# Altium footprint library TH Connectors.PcbLib: 140 footprints (part 7 of 9)
Each footprint in its own frame and in the unit in brackets; x right, y up, seen from the top. Pads: shape width x height; smd on the part's side, far side on the other; paste and mask are expansions set on the pad; w line width, h text height; cw(c..) or ccw(c..) is an arc to the next point about the centre after c.
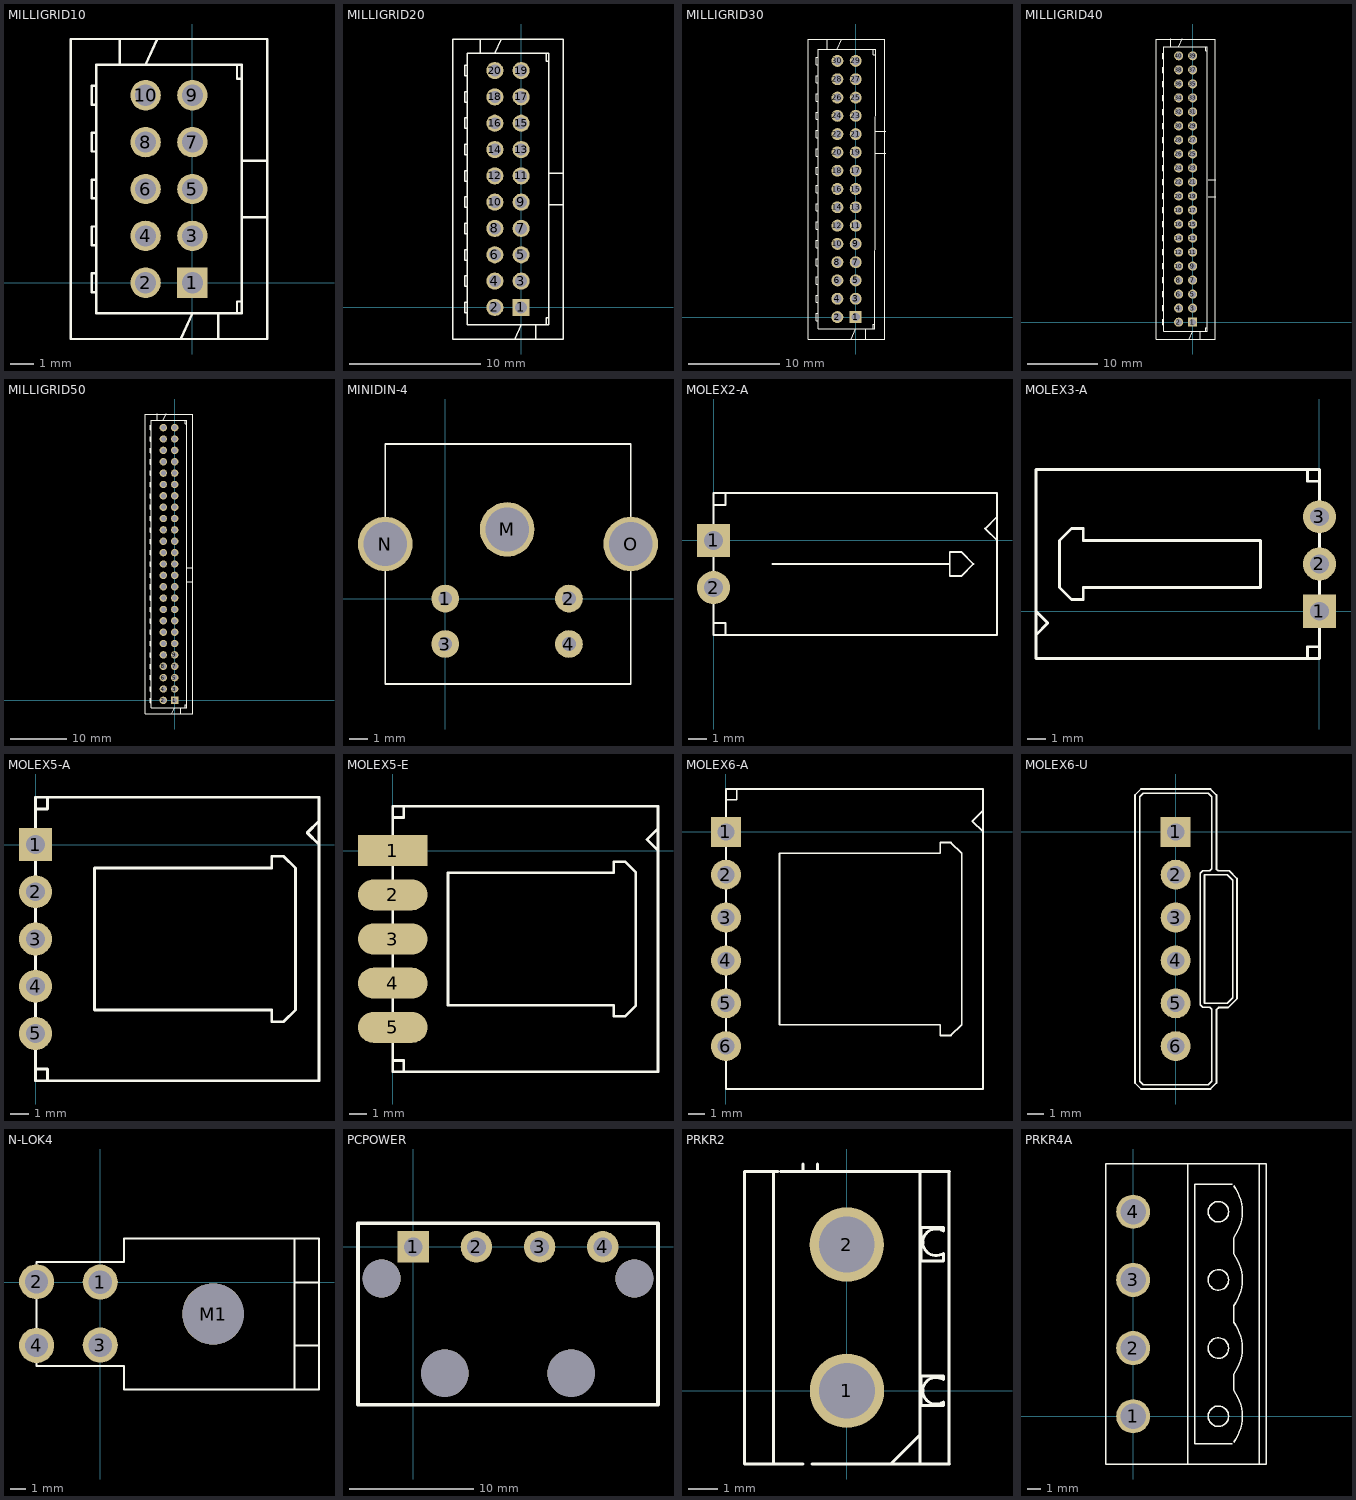
[diagram p6: the footprints below, top view; thin cyan lines are the x and y axes]

## MILLIGRID10 [mm]
pads (10):
  rect 1.3x1.3 hole 0.9: 1(0,0)
  round 1.3 hole 0.9: 2(-2,0) 3(0,2) 4(-2,2) 5(0,4) 6(-2,4) 7(0,6) 8(-2,6) 9(0,8) 10(-2,8)
Top Overlay:
  lines w0.102: -4.1,-0.4 -4.3,-0.4 -4.3,0.2 -4.3,0.4 -4.1,0.4 ; -4.1,1.6 -4.3,1.6 -4.3,2.2 -4.3,2.4 -4.1,2.4 ; -4.1,3.6 -4.3,3.6 -4.3,4.2 -4.3,4.4 -4.1,4.4 ; -4.1,5.6 -4.3,5.6 -4.3,6.2 -4.3,6.4 -4.1,6.4 ; -4.1,7.6 -4.3,7.6 -4.3,8.2 -4.3,8.4 -4.1,8.4 ; -3.1,9.3 -3.1,10.4 ; -2,9.3 -1.5,10.4 ; -0.5,-2.4 0,-1.3 ; 1.1,-2.4 1.1,-1.3 ; 1.9,-1.3 1.9,-0.8 2.1,-0.8 ; 1.9,9.3 1.9,8.7 2.1,8.7 ; 2.1,2.8 3.2,2.8 ; 2.1,5.2 3.2,5.2 ; -5.2,-2.4 -5.2,0 -5.2,10.4 -1,10.4 3.2,10.4 3.2,-2.4 -1,-2.4 -5.2,-2.4 ; -4.3,10.4 -4.1,10.4 -4.3,10.4 ; -4.1,-1.3 -4.1,0 -4.1,9.3 -2.8,9.3 -1,9.3 0.8,9.3 2.1,9.3 2.1,0 2.1,-1.3 0.8,-1.3 -1,-1.3 -2.8,-1.3 -4.1,-1.3

## MILLIGRID20 [mm]
pads (20):
  rect 1.3x1.3 hole 0.9: 1(0,0)
  round 1.3 hole 0.9: 2(-2,0) 3(0,2) 4(-2,2) 5(0,4) 6(-2,4) 7(0,6) 8(-2,6) 9(0,8) 10(-2,8) 11(0,10) 12(-2,10) 13(0,12) 14(-2,12) 15(0,14) 16(-2,14) 17(0,16) 18(-2,16) 19(0,18) 20(-2,18)
Top Overlay:
  lines w0.102: -4.3,20.4 -4.1,20.4 ; -4.1,-0.4 -4.3,-0.4 -4.3,0.2 -4.3,0.4 -4.1,0.4 ; -4.1,1.6 -4.3,1.6 -4.3,2.2 -4.3,2.4 -4.1,2.4 ; -4.1,3.6 -4.3,3.6 -4.3,4.2 -4.3,4.4 -4.1,4.4 ; -4.1,5.6 -4.3,5.6 -4.3,6.2 -4.3,6.4 -4.1,6.4 ; -4.1,7.6 -4.3,7.6 -4.3,8.2 -4.3,8.4 -4.1,8.4 ; -4.1,9.6 -4.3,9.6 -4.3,10.2 -4.3,10.4 -4.1,10.4 ; -4.1,11.6 -4.3,11.6 -4.3,12.2 -4.3,12.4 -4.1,12.4 ; -4.1,13.6 -4.3,13.6 -4.3,14.2 -4.3,14.4 -4.1,14.4 ; -4.1,15.6 -4.3,15.6 -4.3,16.2 -4.3,16.4 -4.1,16.4 ; -4.1,17.6 -4.3,17.6 -4.3,18.2 ; -3.1,19.3 -3.1,20.4 ; -2,19.3 -1.5,20.4 ; -0.5,-2.4 0,-1.3 ; 1.1,-2.4 1.1,-1.3 ; 1.9,-1.3 1.9,-0.8 2.1,-0.8 ; 1.9,19.3 1.9,18.7 2.1,18.7 ; 2.1,7.8 3.2,7.8 ; 2.1,10.2 3.2,10.2 ; -4.3,18.2 -4.3,18.4 ; -4.3,18.2 -4.3,18.4 ; -4.3,18.4 -4.1,18.4 -4.3,18.4 ; -5.2,-2.4 -1,-2.4 3.2,-2.4 3.2,20.4 -1,20.4 -5.2,20.4 -5.2,0 -5.2,-2.4 ; -4.1,-1.3 -2.8,-1.3 -1,-1.3 0.8,-1.3 2.1,-1.3 2.1,0 2.1,19.3 0.8,19.3 -1,19.3 -2.8,19.3 -4.1,19.3 -4.1,0 -4.1,-1.3

## MILLIGRID30 [mm]
pads (30):
  rect 1.3x1.3 hole 0.9: 1(0,0)
  round 1.3 hole 0.9: 2(-2,0) 3(0,2) 4(-2,2) 5(0,4) 6(-2,4) 7(0,6) 8(-2,6) 9(0,8) 10(-2,8) 11(0,10) 12(-2,10) 13(0,12) 14(-2,12) 15(0,14) 16(-2,14) 17(0,16) 18(-2,16) 19(0,18) 20(-2,18) 21(0,20) 22(-2,20) 23(0,22) 24(-2,22) 25(0,24) 26(-2,24) 27(0,26) 28(-2,26) 29(0,28) 30(-2,28)
Top Overlay:
  lines w0.102: -4.3,30.4 -4.1,30.4 ; -4.1,-0.4 -4.3,-0.4 -4.3,0.2 -4.3,0.4 -4.1,0.4 ; -4.1,1.6 -4.3,1.6 -4.3,2.2 -4.3,2.4 -4.1,2.4 ; -4.1,3.6 -4.3,3.6 -4.3,4.2 -4.3,4.4 -4.1,4.4 ; -4.1,5.6 -4.3,5.6 -4.3,6.2 -4.3,6.4 -4.1,6.4 ; -4.1,7.6 -4.3,7.6 -4.3,8.2 -4.3,8.4 -4.1,8.4 ; -4.1,9.6 -4.3,9.6 -4.3,10.2 -4.3,10.4 -4.1,10.4 ; -4.1,11.6 -4.3,11.6 -4.3,12.2 -4.3,12.4 -4.1,12.4 ; -4.1,13.6 -4.3,13.6 -4.3,14.2 -4.3,14.4 -4.1,14.4 ; -4.1,15.6 -4.3,15.6 -4.3,16.2 -4.3,16.4 -4.1,16.4 ; -4.1,17.6 -4.3,17.6 -4.3,18.2 -4.3,18.4 -4.1,18.4 ; -4.1,19.6 -4.3,19.6 -4.3,20.2 -4.3,20.4 -4.1,20.4 ; -4.1,21.6 -4.3,21.6 -4.3,22.2 -4.3,22.4 -4.1,22.4 ; -4.1,23.6 -4.3,23.6 -4.3,24.2 -4.3,24.4 -4.1,24.4 ; -4.1,25.6 -4.3,25.6 -4.3,26.2 -4.3,26.4 -4.1,26.4 ; -4.1,27.6 -4.3,27.6 -4.3,28.2 -4.3,28.4 -4.1,28.4 ; -3.1,29.3 -3.1,30.4 ; -2,29.3 -1.5,30.4 ; -0.5,-2.4 0,-1.3 ; 1.1,-2.4 1.1,-1.3 ; 1.9,-1.3 1.9,-0.8 2.1,-0.8 ; 1.9,29.3 1.9,28.7 2.1,28.7 ; 2.1,29.3 0.8,29.3 -1,29.3 -2.8,29.3 -4.1,29.3 -4.1,0 -4.1,-1.3 -2.8,-1.3 -1,-1.3 0.8,-1.3 2.1,-1.3 2.1,0 2.2,29.3 ; 2.2,17.9 3.3,17.9 ; 2.2,20.3 3.3,20.3 ; -5.2,-2.4 -5.2,0 -5.2,30.4 -1,30.4 3.2,30.4 3.2,-2.4 -1,-2.4 -5.2,-2.4

## MILLIGRID40 [mm]
pads (40):
  rect 1.3x1.3 hole 0.9: 1(0,0)
  round 1.3 hole 0.9: 2(-2,0) 3(0,2) 4(-2,2) 5(0,4) 6(-2,4) 7(0,6) 8(-2,6) 9(0,8) 10(-2,8) 11(0,10) 12(-2,10) 13(0,12) 14(-2,12) 15(0,14) 16(-2,14) 17(0,16) 18(-2,16) 19(0,18) 20(-2,18) 21(0,20) 22(-2,20) 23(0,22) 24(-2,22) 25(0,24) 26(-2,24) 27(0,26) 28(-2,26) 29(0,28) 30(-2,28) 31(0,30) 32(-2,30) 33(0,32) 34(-2,32) 35(0,34) 36(-2,34) 37(0,36) 38(-2,36) 39(0,38) 40(-2,38)
Top Overlay:
  lines w0.102: -4.1,-0.4 -4.3,-0.4 -4.3,0.2 -4.3,0.4 -4.1,0.4 ; -4.1,1.6 -4.3,1.6 -4.3,2.2 -4.3,2.4 -4.1,2.4 ; -4.1,3.6 -4.3,3.6 -4.3,4.2 -4.3,4.4 -4.1,4.4 ; -4.1,5.6 -4.3,5.6 -4.3,6.2 -4.3,6.4 -4.1,6.4 ; -4.1,7.6 -4.3,7.6 -4.3,8.2 -4.3,8.4 -4.1,8.4 ; -4.1,9.6 -4.3,9.6 -4.3,10.2 -4.3,10.4 -4.1,10.4 ; -4.1,11.6 -4.3,11.6 -4.3,12.2 -4.3,12.4 -4.1,12.4 ; -4.1,13.6 -4.3,13.6 -4.3,14.2 -4.3,14.4 -4.1,14.4 ; -4.1,15.6 -4.3,15.6 -4.3,16.2 -4.3,16.4 -4.1,16.4 ; -4.1,17.6 -4.3,17.6 -4.3,18.2 -4.3,18.4 -4.1,18.4 ; -4.1,19.6 -4.3,19.6 -4.3,20.2 -4.3,20.4 -4.1,20.4 ; -4.1,21.6 -4.3,21.6 -4.3,22.2 -4.3,22.4 -4.1,22.4 ; -4.1,23.6 -4.3,23.6 -4.3,24.2 -4.3,24.4 -4.1,24.4 ; -4.1,25.6 -4.3,25.6 -4.3,26.2 -4.3,26.4 -4.1,26.4 ; -4.1,27.6 -4.3,27.6 -4.3,28.2 -4.3,28.4 -4.1,28.4 ; -4.1,29.6 -4.3,29.6 -4.3,30.2 -4.3,30.4 -4.1,30.4 ; -4.1,31.6 -4.3,31.6 -4.3,32.2 -4.3,32.4 -4.1,32.4 ; -4.1,33.6 -4.3,33.6 -4.3,34.2 -4.3,34.4 -4.1,34.4 ; -4.1,35.6 -4.3,35.6 -4.3,36.2 -4.3,36.4 -4.1,36.4 ; -4.1,37.6 -4.3,37.6 -4.3,38.2 -4.3,38.4 -4.1,38.4 ; -3.1,39.3 -3.1,40.4 ; -2,39.3 -1.5,40.4 ; -0.5,-2.4 0,-1.3 ; 1.1,-2.4 1.1,-1.3 ; 1.9,-1.3 1.9,-0.8 2.1,-0.8 ; 1.9,39.3 1.9,38.7 2.1,38.7 ; 2.2,17.9 3.3,17.9 ; 2.2,20.3 3.3,20.3 ; -5.2,-2.4 -1,-2.4 3.2,-2.4 3.2,40.4 -1,40.4 -5.2,40.4 -5.2,0 -5.2,-2.4 ; -4.1,-1.3 -2.8,-1.3 -1,-1.3 0.8,-1.3 2.1,-1.3 2.1,0 2.1,39.3 0.8,39.3 -1,39.3 -2.8,39.3 -4.1,39.3 -4.1,0 -4.1,-1.3

## MILLIGRID50 [mm]
pads (50):
  rect 1.3x1.3 hole 0.9: 1(0,0)
  round 1.3 hole 0.9: 2(-2,0) 3(0,2) 4(-2,2) 5(0,4) 6(-2,4) 7(0,6) 8(-2,6) 9(0,8) 10(-2,8) 11(0,10) 12(-2,10) 13(0,12) 14(-2,12) 15(0,14) 16(-2,14) 17(0,16) 18(-2,16) 19(0,18) 20(-2,18) 21(0,20) 22(-2,20) 23(0,22) 24(-2,22) 25(0,24) 26(-2,24) 27(0,26) 28(-2,26) 29(0,28) 30(-2,28) 31(0,30) 32(-2,30) 33(0,32) 34(-2,32) 35(0,34) 36(-2,34) 37(0,36) 38(-2,36) 39(0,38) 40(-2,38) 41(0,40) 42(-2,40) 43(0,42) 44(-2,42) 45(0,44) 46(-2,44) 47(0,46) 48(-2,46) 49(0,48) 50(-2,48)
Top Overlay:
  lines w0.102: -4.1,-0.4 -4.3,-0.4 -4.3,0.2 -4.3,0.4 -4.1,0.4 ; -4.1,1.6 -4.3,1.6 -4.3,2.2 -4.3,2.4 -4.1,2.4 ; -4.1,3.6 -4.3,3.6 -4.3,4.2 -4.3,4.4 -4.1,4.4 ; -4.1,5.6 -4.3,5.6 -4.3,6.2 -4.3,6.4 -4.1,6.4 ; -4.1,7.6 -4.3,7.6 -4.3,8.2 -4.3,8.4 -4.1,8.4 ; -4.1,9.6 -4.3,9.6 -4.3,10.2 -4.3,10.4 -4.1,10.4 ; -4.1,11.6 -4.3,11.6 -4.3,12.2 -4.3,12.4 -4.1,12.4 ; -4.1,13.6 -4.3,13.6 -4.3,14.2 -4.3,14.4 -4.1,14.4 ; -4.1,15.6 -4.3,15.6 -4.3,16.2 -4.3,16.4 -4.1,16.4 ; -4.1,17.6 -4.3,17.6 -4.3,18.2 -4.3,18.4 -4.1,18.4 ; -4.1,19.6 -4.3,19.6 -4.3,20.2 -4.3,20.4 -4.1,20.4 ; -4.1,21.6 -4.3,21.6 -4.3,22.2 -4.3,22.4 -4.1,22.4 ; -4.1,23.6 -4.3,23.6 -4.3,24.2 -4.3,24.4 -4.1,24.4 ; -4.1,25.6 -4.3,25.6 -4.3,26.2 -4.3,26.4 -4.1,26.4 ; -4.1,27.6 -4.3,27.6 -4.3,28.2 -4.3,28.4 -4.1,28.4 ; -4.1,29.6 -4.3,29.6 -4.3,30.2 -4.3,30.4 -4.1,30.4 ; -4.1,31.6 -4.3,31.6 -4.3,32.2 -4.3,32.4 -4.1,32.4 ; -4.1,33.6 -4.3,33.6 -4.3,34.2 -4.3,34.4 -4.1,34.4 ; -4.1,35.6 -4.3,35.6 -4.3,36.2 -4.3,36.4 -4.1,36.4 ; -4.1,37.6 -4.3,37.6 -4.3,38.2 -4.3,38.4 -4.1,38.4 ; -4.1,39.6 -4.3,39.6 -4.3,40.2 -4.3,40.4 -4.1,40.4 ; -4.1,41.6 -4.3,41.6 -4.3,42.2 -4.3,42.4 -4.1,42.4 ; -4.1,43.6 -4.3,43.6 -4.3,44.2 -4.3,44.4 -4.1,44.4 ; -4.1,45.6 -4.3,45.6 -4.3,46.2 -4.3,46.4 -4.1,46.4 ; -4.1,47.6 -4.3,47.6 -4.3,48.2 -4.3,48.4 -4.1,48.4 ; -3.1,49.3 -3.1,50.4 ; -2,49.3 -1.5,50.4 ; -0.5,-2.4 0,-1.3 ; 1.1,-2.4 1.1,-1.3 ; 1.9,-1.3 1.9,-0.8 2.1,-0.8 ; 1.9,49.3 1.9,48.7 2.1,48.7 ; 2.1,20.9 3.2,20.9 ; 2.1,23.3 3.2,23.3 ; -5.2,-2.4 -5.2,0 -5.2,48 -5.2,50.4 -1,50.4 3.2,50.4 3.2,48 3.2,-2.4 -1,-2.4 -5.2,-2.4 ; -4.1,-1.3 -4.1,0 -4.1,48 -4.1,49.3 -2.8,49.3 -1,49.3 0.8,49.3 2.1,49.3 2.1,0 2.1,-1.3 0.8,-1.3 -1,-1.3 -2.8,-1.3 -4.1,-1.3

## MINIDIN-4 [mm]
pads (7):
  round 1.524 hole 0.762: 1(0,0) 2(6.8,0) 3(0,-2.5) 4(6.8,-2.5)
  round 3 hole 2.4: M(3.4,3.8) N(-3.3,3) O(10.2,3)
Top Overlay:
  lines w0.102: -3.3,-4.7 10.2,-4.7 10.2,8.5 -3.3,8.5 -3.3,-4.7

## MOLEX2-A [mil]
pads (2):
  rect 70x70 hole 40: 1(0,0)
  round 70 hole 40: 2(0,-100)
Top Overlay:
  lines w4: 0,-175 25,-175 25,-200 ; 0,75 25,75 25,100 ; 600,-200 150,-200 0,-200 0,100 150,100 300,100 450,100 600,100 600,-199 ; 600,0 575,25 600,50 ; 500,-50 125,-50 500,-50 ; 500,-50 500,-75 525,-75 550,-50 525,-25 500,-25 500,-50

## MOLEX3-A [mil]
pads (3):
  rect 70x70 hole 40: 1(0,0)
  round 70 hole 40: 2(0,100) 3(0,200)
Top Overlay:
  lines w6: -600,-50 -575,-25 -600,0 ; -25,-100 -25,-75 0,-75 ; -25,300 -25,275 0,275 ; -550,50 -525,25 -500,25 -500,50 -125,50 ; -550,50 -550,150 ; -550,50 -550,150 ; -550,150 -525,175 -500,175 -500,150 -125,150 ; -125,50 -125,150 ; -125,50 -125,150 ; -600,-100 -450,-100 -300,-100 -150,-100 0,-100 0,300 -150,300 -600,300 -600,-100

## MOLEX5-A [mil]
pads (5):
  rect 70x70 hole 40: 1(0,0)
  round 70 hole 40: 2(0,-100) 3(0,-200) 4(0,-300) 5(0,-400)
Top Overlay:
  lines w6: 0,-475 25,-475 25,-500 ; 0,75 25,75 25,100 ; 600,0 575,25 600,50 ; 125,-350 125,-50 ; 125,-350 500,-350 500,-375 525,-375 550,-350 ; 125,-350 125,-50 ; 125,-50 500,-50 500,-25 525,-25 550,-50 ; 550,-350 550,-50 ; 550,-350 550,-50 ; 0,-500 0,100 150,100 300,100 450,100 600,100 600,-500 150,-500 0,-500

## MOLEX5-E [mil]
pads (5):
  rect 157.48x70 smd: 1(0,0)
  oval 157.48x70 smd: 2(0,-100) 3(0,-200) 4(0,-300) 5(0,-400)
Top Overlay:
  lines w6: 0,-475 25,-475 25,-500 ; 0,75 25,75 25,100 ; 600,0 575,25 600,50 ; 125,-350 125,-50 ; 125,-350 500,-350 500,-375 525,-375 550,-350 ; 125,-350 125,-50 ; 125,-50 500,-50 500,-25 525,-25 550,-50 ; 550,-350 550,-50 ; 550,-350 550,-50 ; 0,-500 150,-500 600,-500 600,100 450,100 300,100 150,100 0,100 0,-500

## MOLEX6-A [mil]
pads (6):
  rect 70x70 hole 40: 1(0,0)
  round 70 hole 40: 2(0,-100) 3(0,-200) 4(0,-300) 5(0,-400) 6(0,-500)
Top Overlay:
  lines w4: 0,-500 0,100 150,100 300,100 450,100 600,100 600,-500 600,-600 150,-600 0,-600 ; 0,-453 0,-600 ; 0,75 25,75 25,100 ; 600,0 575,25 600,50 ; 0,-600 0,-600 ; 125,-350 125,-450 500,-450 500,-475 525,-475 550,-450 550,-350 ; 125,-350 125,-50 ; 125,-350 125,-50 ; 125,-50 500,-50 500,-25 525,-25 550,-50 ; 550,-350 550,-50 ; 550,-350 550,-50

## MOLEX6-U [mil]
pads (6):
  rect 70x70 hole 40: 1(0,0)
  round 70 hole 40: 2(0,-100) 3(0,-200) 4(0,-300) 5(0,-400) 6(0,-500)
Top Overlay:
  lines w4: 57,-268 57,-97 63,-91 79,-91 84,-86 84,-41 84,82 76,90 0,90 -76,90 -84,82 -84,-41 -84,-459 -84,-582 -76,-590 0,-590 76,-590 84,-582 84,-459 84,-414 79,-409 63,-409 57,-403 57,-232 ; 133,-251 133,-387 120,-400 95,-400 ; 133,-249 133,-113 120,-100 95,-100 67,-100 67,-250 ; 0,-600 81,-600 95,-586 95,-415 100,-410 122,-410 143,-389 143,-109 125,-91 99,-91 95,-87 95,86 81,100 0,100 -81,100 -95,86 -95,-445 -95,-586 -81,-600 0,-600 ; 0,-600 0,-600 ; 67,-400 67,-250 ; 67,-400 95,-400 ; 67,-400 67,-250 ; 67,-400 95,-400

## N-LOK4 [mil]
pads (5):
  round 90 hole 60: 1(0,0) 2(-163.39,0.98) 3(0,-161.42) 4(-163.39,-162.4)
  round 157.48 hole 157.48: M1(289.37,-81.69)
Top Overlay:
  lines w5: -163.39,-164.37 -163.39,51.18 61.02,51.18 61.02,112.2 561.02,112.2 561.02,-196.85 ; -163.39,0.98 -163.39,-214.57 61.02,-214.57 61.02,-275.59 561.02,-275.59 561.02,33.46 ; 498.03,-275.59 498.03,47.24 ; 498.03,-210.63 498.03,112.2 ; 498.03,-162.4 561.02,-162.4 ; 498.03,-0.98 561.02,-0.98

## PCPOWER [mil]
pads (8):
  rect 100x100 hole 60: 1(0,0)
  round 100 hole 60: 2(200,0) 3(400,0) 4(600,0)
  round 120 hole 120: ""(-100,-100) ""(700,-100)
  round 150 hole 150: ""(100,-400) ""(500,-400)
Top Overlay:
  lines w12: -175,-500 -175,-100 -175,75 775,75 775,-500 -175,-500
3D body: height 333, standoff -152, extent -158,-510.51 758,27

## PRKR2 [mil]
pads (2):
  round 100 hole 75: 1(0,0) 2(-0.24,196.82)
Top Overlay:
  circle w4: c0,200 r40
  circle w4: c0,0 r40
  lines w4: -98.66,-98.46 -98.66,295.24 ; -93.03,295.24 -138.03,295.24 -138.03,-98.46 -78.98,-98.46 ; -89.29,-98.46 -59.29,-98.46 ; -89.29,295.24 -59.29,295.24 ; -59.29,305.24 -59.29,295.24 ; -46.81,-98.46 98.19,-98.46 ; -39.61,305.24 -39.61,295.24 105.39,295.24 ; -35,-20 20,35 ; -35,185 15,235 ; -34.29,295.24 -59.29,295.24 ; -20,-35 35,20 ; -20,165 35,220 ; 58.82,-98.46 98.19,-59.09 ; 130,-15 130,-20 100,-20 100,20 130,20 130,15 ; 130,185 130,175 100,175 100,220 130,220 130,215 ; 130.08,-14.95 cw(c120,0) 130.08,14.95 ; 130.08,185.05 cw(c120,200) 130.08,214.95 ; 137.56,-98.46 137.56,295.24 ; 138.19,-98.46 98.19,-98.46 ; 138.19,295.24 98.19,295.24 98.19,-98.46
3D body: height 397.5, standoff -125, extent -160,-115.01 160,308.99

## PRKR4A [mil]
pads (4):
  round 100 hole 75: 1(0,0) 2(0,200) 3(0,400) 4(0,600)
Top Overlay:
  circle w4: c250,600 r30
  circle w4: c250,400 r30
  circle w4: c250,200 r30
  circle w4: c250,0 r30
  lines w4: 160,-140 160,740 ; 180,-60 180,80 180,520 180,660 ; 180,60 180,-80 200,-80 290,-80 ; 180,120 180,260 ; 180,140 180,280 ; 180,320 180,460 ; 180,340 180,480 ; 180,540 180,680 200,680 290,680 ; 295.14,-76.46 ccw(c190,0) 295.14,76.46 295.14,123.54 ccw(c190,200) 295.14,276.46 295.14,323.54 ccw(c190,400) 295.14,476.46 295.14,523.54 ccw(c190,600) 295.14,676.46 ; 370,-140 370,740 ; -80,-140 390,-140 390,740 -80,740 -80,-140
3D body: height 338.58, standoff -137.8, extent -80,-139.37 392.53,739.37